# Altium footprint library ADP_SMT.PcbLib: 204 footprints (part 13 of 15)
Each footprint in its own frame and in the unit in brackets; x right, y up, seen from the top. Pads: shape width x height; smd on the part's side, far side on the other; paste and mask are expansions set on the pad; w line width, h text height; cw(c..) or ccw(c..) is an arc to the next point about the centre after c.
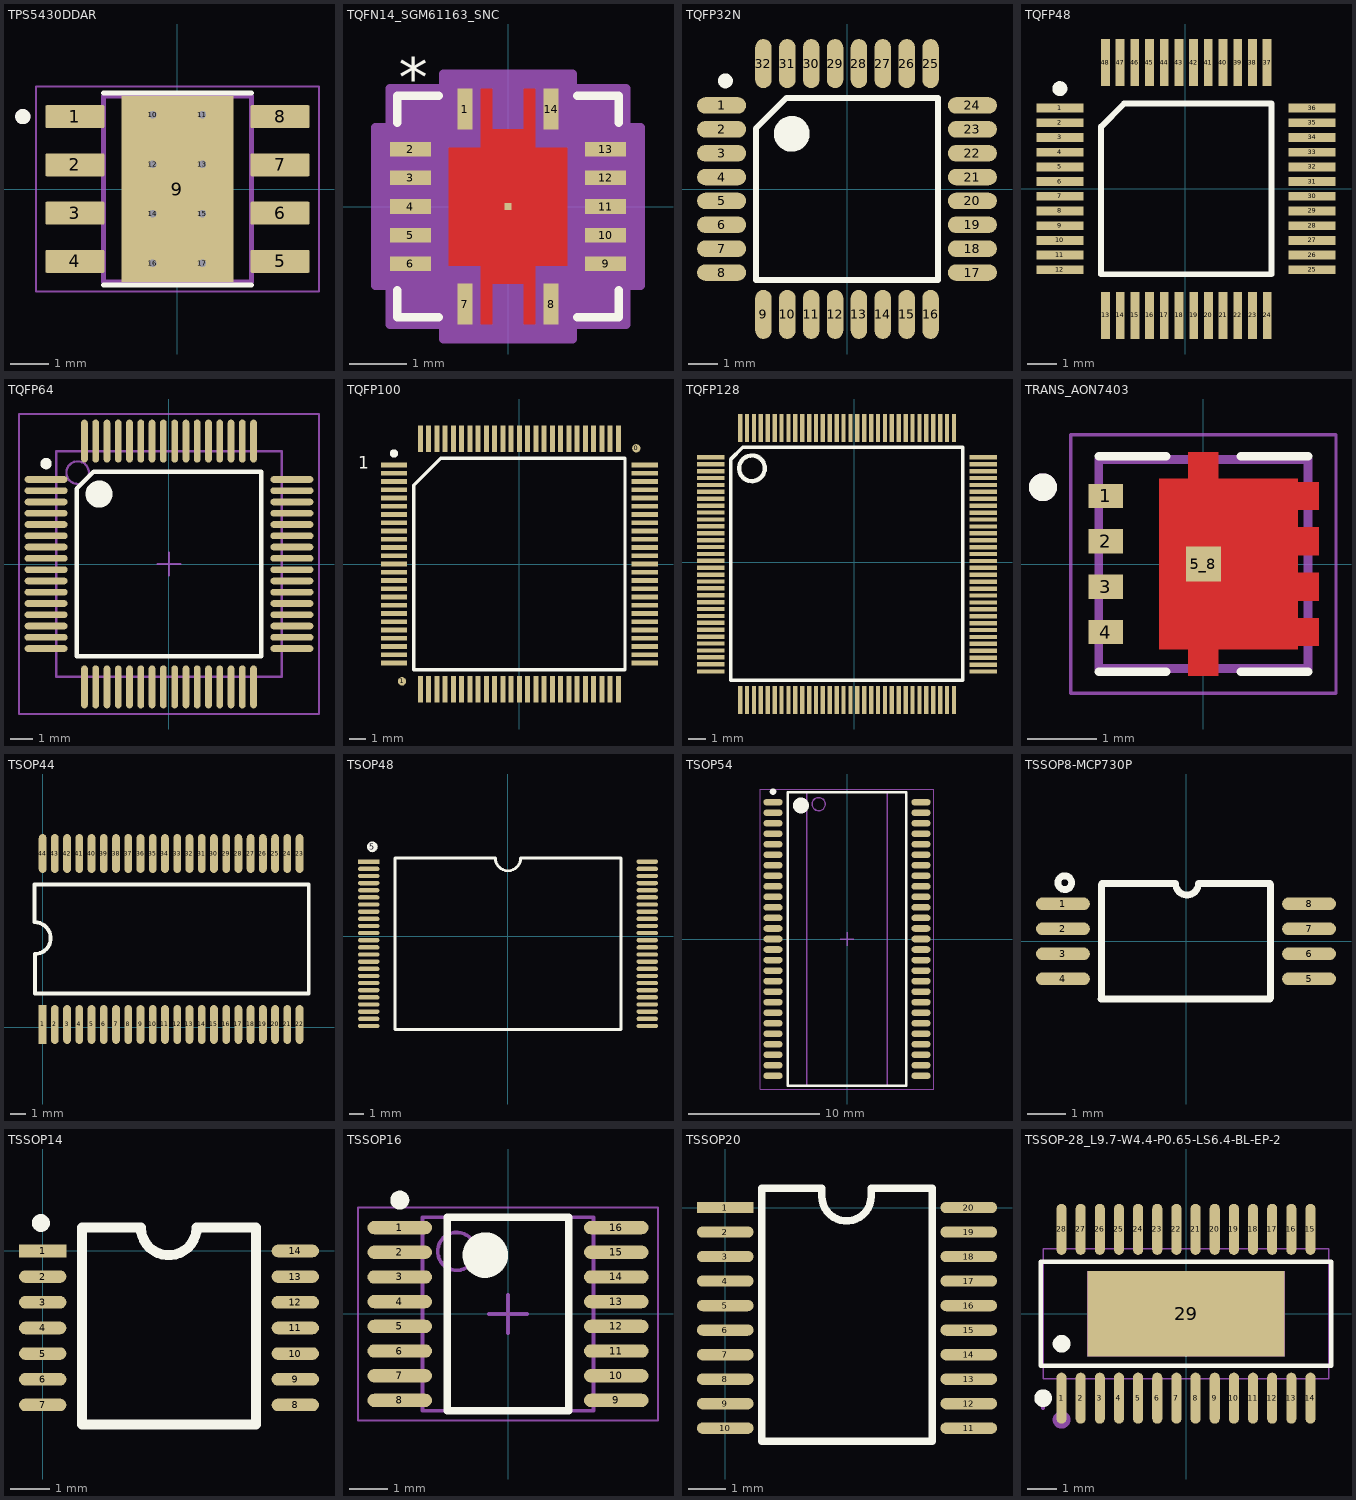
[diagram p12: the footprints below, top view; thin cyan lines are the x and y axes]

## TPS5430DDAR [mm]
pads (17):
  rrect10% 1.55x0.6 smd mask+0: 1(-2.7,1.905) 2(-2.7,0.635) 3(-2.7,-0.635) 4(-2.7,-1.905) 5(2.7,-1.905) 6(2.7,-0.635) 7(2.7,0.635) 8(2.7,1.905)
  rect 2.95x4.9 smd paste-3 mask+0: 9(0,0)
  round 0.3 hole 0.2 mask+0: 10(-0.65,1.95) 11(0.65,1.95) 12(-0.65,0.65) 13(0.65,0.65) 14(-0.65,-0.65) 15(0.65,-0.65) 16(-0.65,-1.95) 17(0.65,-1.95)
Top Overlay:
  circle w0.2: c-4.07,1.905 r0.1
  lines w0.127: -1.95,-2.525 1.95,-2.525 ; -1.95,2.525 1.95,2.525
Top Paste:
  region: 1.3,-1.55 -1.3,-1.55 -1.3,1.55 1.3,1.55
Top Solder:
  drawing of 9 lines, arcs and shapes, not listed
Mechanical 13:
  circle w0.2: c-4.07,1.905 r0.1
  lines w0.127: -1.95,-2.45 1.95,-2.45 1.95,2.45 -1.95,2.45 -1.95,-2.45
Mechanical 15:
  lines w0.05: -3.725,-2.7 3.725,-2.7 3.725,2.7 -3.725,2.7 -3.725,-2.7

## TQFN14_SGM61163_SNC [mil]
pads (15):
  rect 10x28 smd paste+0 mask+0: 1(-29.53,66.93) 7(-29.53,-66.93) 8(29.53,-66.93) 14(29.53,66.93)
  rect 28x10 smd paste+0 mask+0: 2(-66.93,39.38) 3(-66.93,19.69) 4(-66.93,0) 5(-66.93,-19.69) 6(-66.93,-39.38) 9(66.93,-39.38) 10(66.93,-19.69) 11(66.93,0) 12(66.93,19.69) 13(66.93,39.38)
  rect 5x5 smd paste-2.5 mask-2.5: 15(0,0)
Top Layer:
  region: -40.5,-40.5 -40.5,40.5 -18.76,40.5 -18.76,80.93 -10.76,80.93 -10.76,52.93 10.76,52.93 10.76,80.93 18.76,80.93 18.76,40.5 40.5,40.5 40.5,-40.5 18.76,-40.5 18.76,-80.93 10.76,-80.93 10.76,-52.93 -10.76,-52.93 -10.76,-80.93 -18.76,-80.93 -18.76,-40.5
Top Overlay:
  lines w6: -76,-57.48 -76,-76 -47.63,-76 ; -76,57.48 -76,76 -47.63,76 ; 47.63,-76 76,-76 76,-57.48 ; 47.63,76 76,76 76,57.48
  text "*" at -75,65 h50
Top Paste:
  region: -40.5,-40.5 -40.5,40.5 -18.76,40.5 -18.76,80.93 -10.76,80.93 -10.76,52.93 10.76,52.93 10.76,80.93 18.76,80.93 18.76,40.5 40.5,40.5 40.5,-40.5 18.76,-40.5 18.76,-80.93 10.76,-80.93 10.76,-52.93 -10.76,-52.93 -10.76,-80.93 -18.76,-80.93 -18.76,-40.5
Top Solder:
  region: -40.5,-40.5 -40.5,40.5 -18.76,40.5 -18.76,80.93 -10.76,80.93 -10.76,52.93 10.76,52.93 10.76,80.93 18.76,80.93 18.76,40.5 40.5,40.5 40.5,-40.5 18.76,-40.5 18.76,-80.93 10.76,-80.93 10.76,-52.93 -10.76,-52.93 -10.76,-80.93 -18.76,-80.93 -18.76,-40.5
Mechanical 13:
  lines w1: -71,21 -21,71 ; -71,-71 71,-71 71,71 -71,71 -71,-71
  text "*" at -40.43,14.38 h50
Mechanical 15:
  region: 81,-81 81,-54.38 90.93,-54.38 90.93,54.38 81,54.38 81,81 44.53,81 44.53,90.93 -44.53,90.93 -44.53,81 -81,81 -81,54.38 -90.93,54.38 -90.93,-54.38 -81,-54.38 -81,-81 -44.53,-81 -44.53,-90.93 44.53,-90.93 44.53,-81
  lines w6: -90.93,-54.38 -90.93,54.38 -81,54.38 -81,81 -44.53,81 -44.53,90.93 44.53,90.93 44.53,81 81,81 81,54.38 90.93,54.38 90.93,-54.38 81,-54.38 81,-81 44.53,-81 44.53,-90.93 -44.53,-90.93 -44.53,-81 -81,-81 -81,-54.38 -90.93,-54.38 ; -28.76,90.93 -28.76,90.93 ; 28.76,-90.93 28.76,-90.93

## TQFP32N [mm] "TQFP, 32-Leads, Body 9.0x9.0mm (max), Pitch 0.80mm, IPC Medium Density"
height 1.2
pads (32):
  oval 1.65x0.55 smd: 1(-4.202,2.8) 2(-4.202,2) 3(-4.202,1.2) 4(-4.202,0.4) 5(-4.202,-0.4) 6(-4.202,-1.2) 7(-4.202,-2) 8(-4.202,-2.8) 17(4.202,-2.8) 18(4.202,-2) 19(4.202,-1.2) 20(4.202,-0.4) 21(4.202,0.4) 22(4.202,1.2) 23(4.202,2) 24(4.202,2.8)
  oval 0.55x1.65 smd: 9(-2.8,-4.202) 10(-2,-4.202) 11(-1.2,-4.202) 12(-0.4,-4.202) 13(0.4,-4.202) 14(1.2,-4.202) 15(2,-4.202) 16(2.8,-4.202) 25(2.8,4.202) 26(2,4.202) 27(1.2,4.202) 28(0.4,4.202) 29(-0.4,4.202) 30(-1.2,4.202) 31(-2,4.202) 32(-2.8,4.202)
Top Overlay:
  circle w0.25: c-4.075,3.625 r0.125
  circle w0.6: c-1.85,1.85 r0.3
  lines w0.2: -3.048,-3.048 3.048,-3.048 3.048,3.048 -2.032,3.048 -3.048,2.032 -3.048,-3.048
3D body "User Library-TQFP32-1.step": height 1.1, standoff 0, extent -4.509,-4.483 4.509,4.534

## TQFP48 [mm]
pads (48):
  rect 1.6x0.3 smd: 1(-4.267,2.743) 2(-4.267,2.243) 3(-4.267,1.743) 4(-4.267,1.243) 5(-4.267,0.743) 6(-4.267,0.243) 7(-4.267,-0.257) 8(-4.267,-0.757) 9(-4.267,-1.257) 10(-4.267,-1.757) 11(-4.267,-2.257) 12(-4.267,-2.757) 25(4.314,-2.757) 26(4.314,-2.257) 27(4.314,-1.757) 28(4.314,-1.257) 29(4.314,-0.757) 30(4.314,-0.257) 31(4.314,0.243) 32(4.314,0.743) 33(4.314,1.243) 34(4.314,1.743) 35(4.314,2.243) 36(4.314,2.743)
  rect 0.3x1.6 smd: 13(-2.714,-4.31) 14(-2.214,-4.31) 15(-1.714,-4.31) 16(-1.214,-4.31) 17(-0.714,-4.31) 18(-0.214,-4.31) 19(0.286,-4.31) 20(0.786,-4.31) 21(1.286,-4.31) 22(1.786,-4.31) 23(2.286,-4.31) 24(2.786,-4.31) 37(2.781,4.293) 38(2.281,4.293) 39(1.781,4.293) 40(1.281,4.293) 41(0.781,4.293) 42(0.281,4.293) 43(-0.219,4.293) 44(-0.719,4.293) 45(-1.219,4.293) 46(-1.719,4.293) 47(-2.219,4.293) 48(-2.719,4.293)
Top Overlay:
  circle w0.254: c-4.267,3.404 r0.127
  lines w0.2: -2.864,-2.907 2.936,-2.907 2.936,2.893
  lines w0.203: -2.864,-2.907 -2.864,2.114 -2.085,2.893 2.936,2.893
3D body "TQFP48.STEP": height 1.1, standoff 0, extent -4.483,-4.509 4.534,4.509

## TQFP64 [mm]
pads (64):
  oval 1.9x0.3 smd: 1(-5.45,3.75) 2(-5.45,3.25) 3(-5.45,2.75) 4(-5.45,2.25) 5(-5.45,1.75) 6(-5.45,1.25) 7(-5.45,0.75) 8(-5.45,0.25) 9(-5.45,-0.25) 10(-5.45,-0.75) 11(-5.45,-1.25) 12(-5.45,-1.75) 13(-5.45,-2.25) 14(-5.45,-2.75) 15(-5.45,-3.25) 16(-5.45,-3.75) 33(5.45,-3.75) 34(5.45,-3.25) 35(5.45,-2.75) 36(5.45,-2.25) 37(5.45,-1.75) 38(5.45,-1.25) 39(5.45,-0.75) 40(5.45,-0.25) 41(5.45,0.25) 42(5.45,0.75) 43(5.45,1.25) 44(5.45,1.75) 45(5.45,2.25) 46(5.45,2.75) 47(5.45,3.25) 48(5.45,3.75)
  oval 0.3x1.9 smd: 17(-3.75,-5.45) 18(-3.25,-5.45) 19(-2.75,-5.45) 20(-2.25,-5.45) 21(-1.75,-5.45) 22(-1.25,-5.45) 23(-0.75,-5.45) 24(-0.25,-5.45) 25(0.25,-5.45) 26(0.75,-5.45) 27(1.25,-5.45) 28(1.75,-5.45) 29(2.25,-5.45) 30(2.75,-5.45) 31(3.25,-5.45) 32(3.75,-5.45) 49(3.75,5.45) 50(3.25,5.45) 51(2.75,5.45) 52(2.25,5.45) 53(1.75,5.45) 54(1.25,5.45) 55(0.75,5.45) 56(0.25,5.45) 57(-0.25,5.45) 58(-0.75,5.45) 59(-1.25,5.45) 60(-1.75,5.45) 61(-2.25,5.45) 62(-2.75,5.45) 63(-3.25,5.45) 64(-3.75,5.45)
Top Overlay:
  circle w0.6: c-3.1,3.1 r0.3
  circle w0.25: c-5.45,4.45 r0.125
  lines w0.2: -4.1,-4.1 4.1,-4.1 4.1,4.1 -3.342,4.1 -4.1,3.342 -4.1,-4.1
Mechanical 13:
  circle w0.1: c-4.05,4.05 r0.5
  lines w0.1: -5,-5 5,-5 5,5 -5,5 -5,-5
Mechanical 15:
  lines w0.1: -0.5,0 0.5,0 ; 0,-0.5 0,0.5 ; -6.65,-6.65 6.65,-6.65 6.65,6.65 -6.65,6.65 -6.65,-6.65
3D body "TQFP64_1.STEP": height 1, standoff -0.06, extent -6,-6.006 6,5.994

## TQFP100 [mm]
pads (102):
  round 0.508 smd: 0(7.087,7.01) 1(-7.112,-7.112)
  rect 1.6x0.3 smd: 1(-7.6,6) 2(-7.6,5.5) 3(-7.6,5) 4(-7.6,4.5) 5(-7.6,4) 6(-7.6,3.5) 7(-7.6,3) 8(-7.6,2.5) 9(-7.6,2) 10(-7.6,1.5) 11(-7.6,1) 12(-7.6,0.5) 13(-7.6,0) 14(-7.6,-0.5) 15(-7.6,-1) 16(-7.6,-1.5) 17(-7.6,-2) 18(-7.6,-2.5) 19(-7.6,-3) 20(-7.6,-3.5) 21(-7.6,-4) 22(-7.6,-4.5) 23(-7.6,-5) 24(-7.6,-5.5) 25(-7.6,-6) 51(7.6,-6) 52(7.6,-5.5) 53(7.6,-5) 54(7.6,-4.5) 55(7.6,-4) 56(7.6,-3.5) 57(7.6,-3) 58(7.6,-2.5) 59(7.6,-2) 60(7.6,-1.5) 61(7.6,-1) 62(7.6,-0.5) 63(7.6,0) 64(7.6,0.5) 65(7.6,1) 66(7.6,1.5) 67(7.6,2) 68(7.6,2.5) 69(7.6,3) 70(7.6,3.5) 71(7.6,4) 72(7.6,4.5) 73(7.6,5) 74(7.6,5.5) 75(7.6,6)
  rect 0.3x1.6 smd: 26(-6,-7.6) 27(-5.5,-7.6) 28(-5,-7.6) 29(-4.5,-7.6) 30(-4,-7.6) 31(-3.5,-7.6) 32(-3,-7.6) 33(-2.5,-7.6) 34(-2,-7.6) 35(-1.5,-7.6) 36(-1,-7.6) 37(-0.5,-7.6) 38(0,-7.6) 39(0.5,-7.6) 40(1,-7.6) 41(1.5,-7.6) 42(2,-7.6) 43(2.5,-7.6) 44(3,-7.6) 45(3.5,-7.6) 46(4,-7.6) 47(4.5,-7.6) 48(5,-7.6) 49(5.5,-7.6) 50(6,-7.6) 76(6,7.6) 77(5.5,7.6) 78(5,7.6) 79(4.5,7.6) 80(4,7.6) 81(3.5,7.6) 82(3,7.6) 83(2.5,7.6) 84(2,7.6) 85(1.5,7.6) 86(1,7.6) 87(0.5,7.6) 88(0,7.6) 89(-0.5,7.6) 90(-1,7.6) 91(-1.5,7.6) 92(-2,7.6) 93(-2.5,7.6) 94(-3,7.6) 95(-3.5,7.6) 96(-4,7.6) 97(-4.5,7.6) 98(-5,7.6) 99(-5.5,7.6) 100(-6,7.6)
Top Overlay:
  circle w0.25: c-7.6,6.7 r0.125
  lines w0.2: -6.4,-6.4 6.4,-6.4 6.4,6.4 -4.776,6.4 -6.4,4.776 -6.4,-6.4
  text "1" at -9.779,5.766 h0.76
3D body "TQFP100.STEP": height 1.05, standoff -0.1, extent -7.949,-8.026 8.051,7.974

## TQFP128 [mm]
pads (128):
  rect 1.6x0.25 smd: 1(-8.331,6.071) 2(-8.331,5.671) 3(-8.331,5.271) 4(-8.331,4.871) 5(-8.331,4.471) 6(-8.331,4.071) 7(-8.331,3.671) 8(-8.331,3.271) 9(-8.331,2.871) 10(-8.331,2.471) 11(-8.331,2.071) 12(-8.331,1.671) 13(-8.331,1.271) 14(-8.331,0.871) 15(-8.331,0.471) 16(-8.331,0.071) 17(-8.331,-0.329) 18(-8.331,-0.729) 19(-8.331,-1.129) 20(-8.331,-1.529) 21(-8.331,-1.929) 22(-8.331,-2.329) 23(-8.331,-2.729) 24(-8.331,-3.129) 25(-8.331,-3.529) 26(-8.331,-3.929) 27(-8.331,-4.329) 28(-8.331,-4.729) 29(-8.331,-5.129) 30(-8.331,-5.529) 31(-8.331,-5.929) 32(-8.331,-6.35) 65(7.468,-6.35) 66(7.468,-5.949) 67(7.468,-5.549) 68(7.468,-5.148) 69(7.468,-4.747) 70(7.468,-4.347) 71(7.468,-3.946) 72(7.468,-3.545) 73(7.468,-3.145) 74(7.468,-2.744) 75(7.468,-2.343) 76(7.468,-1.943) 77(7.468,-1.542) 78(7.468,-1.141) 79(7.468,-0.741) 80(7.468,-0.34) 81(7.468,0.061) 82(7.468,0.461) 83(7.468,0.862) 84(7.468,1.263) 85(7.468,1.663) 86(7.468,2.064) 87(7.468,2.465) 88(7.468,2.865) 89(7.468,3.266) 90(7.468,3.667) 91(7.468,4.067) 92(7.468,4.468) 93(7.468,4.869) 94(7.468,5.269) 95(7.468,5.67) 96(7.468,6.071)
  rect 0.25x1.6 smd: 33(-6.629,-8.001) 34(-6.229,-8.001) 35(-5.829,-8.001) 36(-5.429,-8.001) 37(-5.029,-8.001) 38(-4.629,-8.001) 39(-4.229,-8.001) 40(-3.829,-8.001) 41(-3.429,-8.001) 42(-3.029,-8.001) 43(-2.629,-8.001) 44(-2.229,-8.001) 45(-1.829,-8.001) 46(-1.429,-8.001) 47(-1.029,-8.001) 48(-0.629,-8.001) 49(-0.229,-8.001) 50(0.171,-8.001) 51(0.571,-8.001) 52(0.971,-8.001) 53(1.371,-8.001) 54(1.771,-8.001) 55(2.171,-8.001) 56(2.571,-8.001) 57(2.971,-8.001) 58(3.371,-8.001) 59(3.771,-8.001) 60(4.171,-8.001) 61(4.571,-8.001) 62(4.971,-8.001) 63(5.371,-8.001) 64(5.771,-8.001) 97(5.771,7.772) 98(5.371,7.772) 99(4.971,7.772) 100(4.571,7.772) 101(4.171,7.772) 102(3.771,7.772) 103(3.371,7.772) 104(2.971,7.772) 105(2.571,7.772) 106(2.171,7.772) 107(1.771,7.772) 108(1.371,7.772) 109(0.971,7.772) 110(0.571,7.772) 111(0.171,7.772) 112(-0.229,7.772) 113(-0.629,7.772) 114(-1.029,7.772) 115(-1.429,7.772) 116(-1.829,7.772) 117(-2.229,7.772) 118(-2.629,7.772) 119(-3.029,7.772) 120(-3.429,7.772) 121(-3.829,7.772) 122(-4.229,7.772) 123(-4.629,7.772) 124(-5.029,7.772) 125(-5.429,7.772) 126(-5.829,7.772) 127(-6.229,7.772) 128(-6.629,7.772)
Top Overlay:
  circle w0.254: c-5.944,5.436 r0.744
  lines w0.203: -7.188,-6.858 6.274,-6.858 6.274,6.655 -6.477,6.655 -7.188,5.944 -7.188,-6.858
3D body "User Library-TQFP128.STEP": height 1.1, standoff 0, extent -8.433,-8.144 7.584,7.874

## TRANS_AON7403 [mm]
pads (5):
  rect 0.5x0.35 smd: 1(-1.4,0.975) 2(-1.4,0.325) 3(-1.4,-0.325) 4(-1.4,-0.975)
  rect 0.5x0.5 smd paste-1 mask+0: 5_8(0,0)
Top Layer:
  region: 0.215,1.225 1.35,1.225 1.35,1.175 1.65,1.175 1.65,0.775 1.35,0.775 1.35,0.525 1.65,0.525 1.65,0.125 1.35,0.125 1.35,-0.125 1.65,-0.125 1.65,-0.525 1.35,-0.525 1.35,-0.775 1.65,-0.775 1.65,-1.175 1.35,-1.175 1.35,-1.225 0.215,-1.225 0.215,-1.605 -0.215,-1.605 -0.215,-1.225 -0.63,-1.225 -0.63,1.225 -0.215,1.225 -0.215,1.605 0.215,1.605
Top Overlay:
  circle w0.2: c-2.3,1.1 r0.1
  lines w0.127: -1.5,-1.545 -0.535,-1.545 ; -1.5,1.545 -0.535,1.545 ; 0.535,-1.545 1.5,-1.545 ; 0.535,1.545 1.5,1.545
Top Paste:
  region: 1.65,-1.175 1.355,-1.175 1.355,-0.775 1.65,-0.775
  region: 1.65,-0.525 1.355,-0.525 1.355,-0.125 1.65,-0.125
  region: 1.65,0.125 1.355,0.125 1.355,0.525 1.65,0.525
  region: 1.65,0.775 1.355,0.775 1.355,1.175 1.65,1.175
  region: 0.215,-1.605 -0.215,-1.605 -0.215,-1.23 0.215,-1.23
  region: 0.215,1.23 -0.215,1.23 -0.215,1.605 0.215,1.605
  region: 0.985,-0.775 -0.265,-0.775 -0.265,0.775 0.985,0.775
Top Solder:
  region: 0.315,1.325 1.45,1.325 1.45,1.275 1.75,1.275 1.75,-1.275 1.45,-1.275 1.45,-1.325 0.315,-1.325 0.315,-1.705 -0.315,-1.705 -0.315,-1.325 -0.73,-1.325 -0.73,1.325 -0.315,1.325 -0.315,1.705 0.315,1.705
Mechanical 13:
  circle w0.2: c-2.3,1.1 r0.1
  lines w0.127: -1.5,-1.5 -1.5,1.5 1.5,1.5 1.5,-1.5 -1.5,-1.5
Mechanical 15:
  lines w0.05: -1.9,-1.855 -1.9,1.855 1.9,1.855 1.9,-1.855 -1.9,-1.855

## TSOP44 [mil]
pads (44):
  rect 20x100 smd: 1(0,7)
  oval 20x100 smd: 2(31.5,7) 3(63,7) 4(94.5,7) 5(126,7) 6(157.5,7) 7(189,7) 8(220.5,7) 9(252,7) 10(283.5,7) 11(315,7) 12(346.5,7) 13(378,7) 14(409.5,7) 15(441,7) 16(472.5,7) 17(504,7) 18(535.5,7) 19(567,7) 20(598.5,7) 21(630,7) 22(661.5,7) 23(661.5,447) 24(630,447) 25(598.5,447) 26(567,447) 27(535.5,447) 28(504,447) 29(472.5,447) 30(441,447) 31(409.5,447) 32(378,447) 33(346.5,447) 34(315,447) 35(283.5,447) 36(252,447) 37(220.5,447) 38(189,447) 39(157.5,447) 40(126,447) 41(94.5,447) 42(63,447) 43(31.5,447) 44(0,447)
Top Overlay:
  lines w10: -20.59,270 -20.59,367 685,367 685,87 -20,87 -20,183.41 ; -20,188.4 ccw(c-20,229.2) -20,270
3D body "TSOP44.STEP": height 48.24, standoff -3.69, extent -27.46,-5 689.47,457.99

## TSOP48 [mm]
pads (49):
  rect 1.5x0.3 smd: 1(-9.754,5.229)
  oval 1.5x0.3 smd: 2(-9.754,4.729) 3(-9.754,4.229) 4(-9.754,3.729) 5(-9.754,3.229) 6(-9.754,2.729) 7(-9.754,2.229) 8(-9.754,1.729) 9(-9.754,1.229) 10(-9.754,0.729) 11(-9.754,0.229) 12(-9.754,-0.271) 13(-9.754,-0.771) 14(-9.754,-1.271) 15(-9.754,-1.771) 16(-9.754,-2.271) 17(-9.754,-2.771) 18(-9.754,-3.271) 19(-9.754,-3.771) 20(-9.754,-4.271) 21(-9.754,-4.771) 22(-9.754,-5.271) 23(-9.754,-5.771) 24(-9.754,-6.271) 25(9.754,-6.271) 26(9.754,-5.771) 27(9.754,-5.271) 28(9.754,-4.771) 29(9.754,-4.271) 30(9.754,-3.771) 31(9.754,-3.271) 32(9.754,-2.771) 33(9.754,-2.271) 34(9.754,-1.771) 35(9.754,-1.271) 36(9.754,-0.771) 37(9.754,-0.271) 38(9.754,0.229) 39(9.754,0.729) 40(9.754,1.229) 41(9.754,1.729) 42(9.754,2.229) 43(9.754,2.729) 44(9.754,3.229) 45(9.754,3.729) 46(9.754,4.229) 47(9.754,4.729) 48(9.754,5.229)
  round 0.762 on Top Overlay: 5(-9.5,6.271)
Top Overlay:
  lines w0.2: -7.915,-6.521 -7.915,5.479 -0.883,5.479 ccw(c0,5.479) 0.883,5.479 7.915,5.479 7.915,-6.521 -7.915,-6.521
3D body "TSOP48.STEP": height 1.2, standoff -0.06, extent -10.05,-6.591 10.05,5.509

## TSOP54 [mm] "TSOP, 54-Leads, Body 22.20x6.00mm, Pitch 0.80mm, IPC Medium Density"
height 1.1
pads (54):
  oval 1.45x0.5 smd: 1(-5.625,10.4) 2(-5.625,9.6) 3(-5.625,8.8) 4(-5.625,8) 5(-5.625,7.2) 6(-5.625,6.4) 7(-5.625,5.6) 8(-5.625,4.8) 9(-5.625,4) 10(-5.625,3.2) 11(-5.625,2.4) 12(-5.625,1.6) 13(-5.625,0.8) 14(-5.625,0) 15(-5.625,-0.8) 16(-5.625,-1.6) 17(-5.625,-2.4) 18(-5.625,-3.2) 19(-5.625,-4) 20(-5.625,-4.8) 21(-5.625,-5.6) 22(-5.625,-6.4) 23(-5.625,-7.2) 24(-5.625,-8) 25(-5.625,-8.8) 26(-5.625,-9.6) 27(-5.625,-10.4) 28(5.625,-10.4) 29(5.625,-9.6) 30(5.625,-8.8) 31(5.625,-8) 32(5.625,-7.2) 33(5.625,-6.4) 34(5.625,-5.6) 35(5.625,-4.8) 36(5.625,-4) 37(5.625,-3.2) 38(5.625,-2.4) 39(5.625,-1.6) 40(5.625,-0.8) 41(5.625,0) 42(5.625,0.8) 43(5.625,1.6) 44(5.625,2.4) 45(5.625,3.2) 46(5.625,4) 47(5.625,4.8) 48(5.625,5.6) 49(5.625,6.4) 50(5.625,7.2) 51(5.625,8) 52(5.625,8.8) 53(5.625,9.6) 54(5.625,10.4)
Top Overlay:
  circle w0.25: c-5.625,11.2 r0.125
  circle w0.6: c-3.5,10.15 r0.3
  lines w0.2: -4.5,-11.15 -4.5,11.15 4.5,11.15 4.5,-11.15 -4.5,-11.15
Mechanical 13:
  circle w0.1: c-2.15,10.25 r0.5
  lines w0.1: -3.05,-11.15 -3.05,11.15 3.05,11.15 3.05,-11.15 -3.05,-11.15
Mechanical 15:
  lines w0.05: -6.6,-11.4 -6.6,11.4 6.6,11.4 6.6,-11.4 -6.6,-11.4
  lines w0.1: -0.5,0 0.5,0 ; 0,-0.5 0,0.5
3D body "tSOP-54.step": height 1.25, standoff 0, extent -5.855,-11.095 5.906,11.125

## TSSOP8-MCP730P [mm]
pads (8):
  oval 1.4x0.33 smd: 1(-3.2,0.975) 2(-3.2,0.325) 3(-3.2,-0.325) 4(-3.2,-0.975) 5(3.2,-0.975) 6(3.2,-0.325) 7(3.2,0.325) 8(3.2,0.975)
Top Overlay:
  circle w0.178: c-3.151,1.524 r0.18
  lines w0.178: -2.21,-1.5 2.184,-1.5 ; -2.2,-1.475 -2.2,1.475 ; -2.184,1.5 -0.271,1.5 ccw(c0.025,1.499) 0.321,1.5 ; 0.346,1.5 2.184,1.5 ; 2.2,-1.475 2.2,1.475
3D body "TSS0P8.step": height 1.09, standoff 0, extent -3.115,-1.575 3.165,1.425

## TSSOP14 [mm]
pads (14):
  rect 1.2x0.32 smd: 1(0,0)
  oval 1.2x0.32 smd: 2(0,-0.65) 3(0,-1.3) 4(0,-1.95) 5(0,-2.6) 6(0,-3.25) 7(0,-3.9) 8(6.4,-3.9) 9(6.4,-3.25) 10(6.4,-2.6) 11(6.4,-1.95) 12(6.4,-1.3) 13(6.4,-0.65) 14(6.4,0)
Top Overlay:
  lines w0.254: 0,0.8 ccw(c-0.045,0.711) 0.026,0.781 ; 1,-4.4 5.4,-4.4 5.4,0.6 3.9,0.6 cw(c3.194,0.6) 2.487,0.6 1,0.6 1,-4.4
3D body "TSSOP14.STEP": height 1.2, standoff 0, extent 0.026,-4.506 6.426,0.594

## TSSOP16 [mm] "TSOP, 16-Leads, Body 5.00x4.40mm, Pitch 0.65mm, IPC Medium Density"
height 1.2
pads (16):
  oval 1.7x0.35 smd: 1(-2.85,2.275) 2(-2.85,1.625) 3(-2.85,0.975) 4(-2.85,0.325) 5(-2.85,-0.325) 6(-2.85,-0.975) 7(-2.85,-1.625) 8(-2.85,-2.275) 9(2.85,-2.275) 10(2.85,-1.625) 11(2.85,-0.975) 12(2.85,-0.325) 13(2.85,0.325) 14(2.85,0.975) 15(2.85,1.625) 16(2.85,2.275)
Top Overlay:
  circle w0.6: c-0.6,1.55 r0.3
  circle w0.25: c-2.85,3 r0.125
  lines w0.2: -1.6,-2.55 1.6,-2.55 1.6,2.55 -1.6,2.55 -1.6,-2.55
Mechanical 13:
  circle w0.1: c-1.35,1.65 r0.5
  lines w0.1: -2.25,-2.55 2.25,-2.55 2.25,2.55 -2.25,2.55 -2.25,-2.55
Mechanical 15:
  lines w0.05: -3.95,-2.8 3.95,-2.8 3.95,2.8 -3.95,2.8 -3.95,-2.8
  lines w0.1: -0.5,0 0.5,0 ; 0,-0.5 0,0.5
3D body "TSSOP16.step": height 1.09, standoff 0, extent -3.115,-2.515 3.165,2.485

## TSSOP20 [mm]
pads (20):
  rect 1.5x0.3 smd: 1(0,0)
  oval 1.5x0.3 smd: 2(0,-0.65) 3(0,-1.3) 4(0,-1.95) 5(0,-2.6) 6(0,-3.25) 7(0,-3.9) 8(0,-4.55) 9(0,-5.2) 10(0,-5.85) 11(6.454,-5.85) 12(6.454,-5.2) 13(6.454,-4.55) 14(6.454,-3.9) 15(6.454,-3.25) 16(6.454,-2.6) 17(6.454,-1.95) 18(6.454,-1.3) 19(6.454,-0.65) 20(6.454,0)
Top Overlay:
  lines w0.2: 0.965,-6.2 0.965,0.508 2.559,0.508 2.559,0.3 ccw(c3.214,0.3) 3.87,0.3 3.87,0.508 5.486,0.508 5.486,-6.2 0.965,-6.2
3D body "TSSOP-20.STEP": height 1.2, standoff 0, extent -0.049,-6.221 6.501,0.379

## TSSOP-28_L9.7-W4.4-P0.65-LS6.4-BL-EP-2 [mm]
pads (29):
  oval 0.343x1.731 smd: 1(-4.225,-2.866) 2(-3.575,-2.866) 3(-2.925,-2.866) 4(-2.275,-2.866) 5(-1.625,-2.866) 6(-0.975,-2.866) 7(-0.325,-2.866) 8(0.325,-2.866) 9(0.975,-2.866) 10(1.625,-2.866) 11(2.275,-2.866) 12(2.925,-2.866) 13(3.575,-2.866) 14(4.225,-2.866) 15(4.225,2.866) 16(3.575,2.866) 17(2.925,2.866) 18(2.275,2.866) 19(1.625,2.866) 20(0.975,2.866) 21(0.325,2.866) 22(-0.325,2.866) 23(-0.975,2.866) 24(-1.625,2.866) 25(-2.275,2.866) 26(-2.925,2.866) 27(-3.575,2.866) 28(-4.225,2.866)
  rect 6.7x2.9 smd paste+0 mask+0.05: 29(0,0)
Top Overlay:
  circle w0.3: c-4.225,-1.019 r0.15
  circle w0.3: c-4.849,-2.866 r0.15
  lines w0.152: -4.926,-1.771 4.926,-1.771 4.926,1.772 -4.926,1.772 -4.926,-1.771
Mechanical 6:
  circle w0.3: c-4.225,-3.6 r0.15
Mechanical 15:
  drawing of 62 lines, arcs and shapes, not listed